# Altium footprint library connectors.PcbLib: 98 footprints (part 1 of 7)
Each footprint in its own frame and in the unit in brackets; x right, y up, seen from the top. Pads: shape width x height; smd on the part's side, far side on the other; paste and mask are expansions set on the pad; w line width, h text height; cw(c..) or ccw(c..) is an arc to the next point about the centre after c.
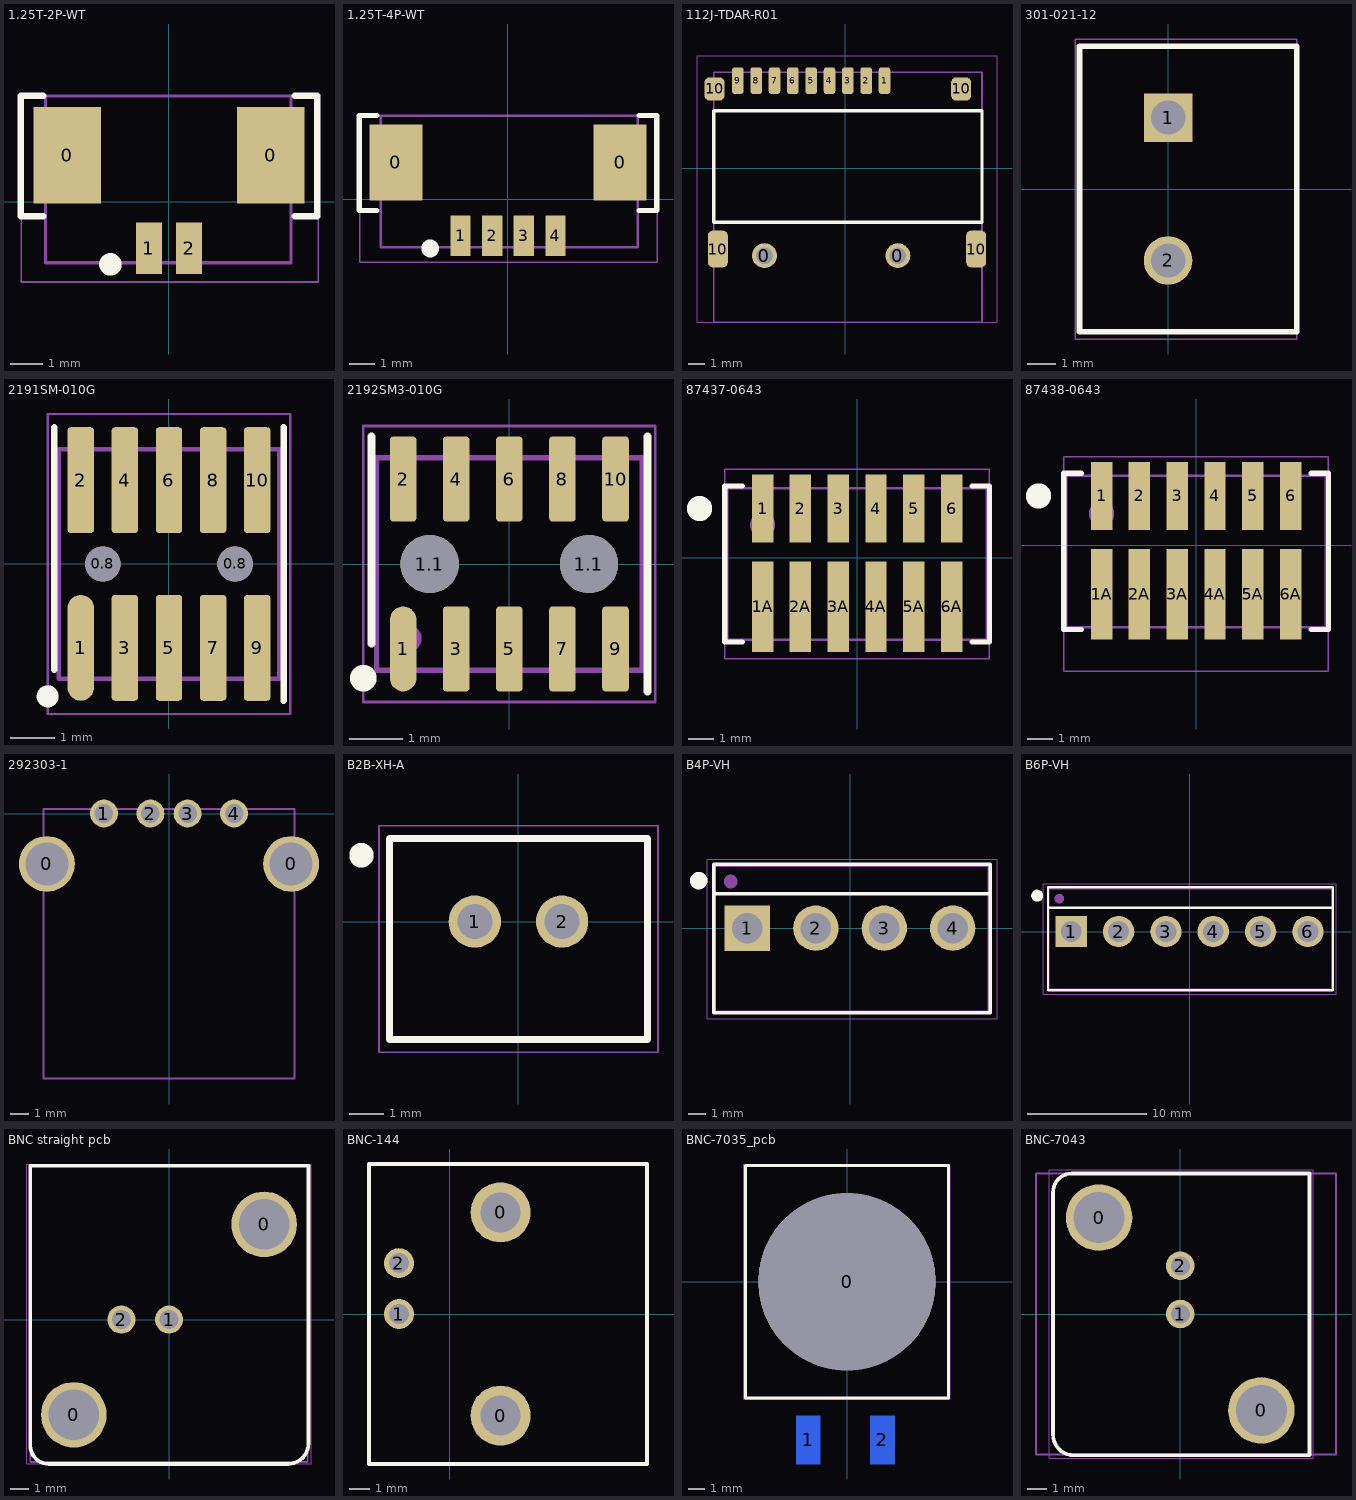
[diagram p0: the footprints below, top view; thin cyan lines are the x and y axes]

## 1.25T-2P-WT [mm]
pads (4):
  rect 2.1x3 smd: 0(-3.175,1.45) 0(3.175,1.45)
  rect 0.8x1.6 smd: 1(-0.625,-1.45) 2(0.625,-1.45)
Top Overlay:
  circle w0.5: c-1.825,-1.95 r0.1
  lines w0.2: -3.925,-0.45 -4.625,-0.45 -4.625,3.3 -3.925,3.3 ; 3.925,-0.45 4.625,-0.45 4.625,3.3 3.925,3.3
Top Assy:
  lines w0.1: -3.85,-1.9 -3.85,3.3 3.8,3.3 3.8,-1.9 -3.85,-1.9
Top Cortyard:
  lines w0.05: -4.6,-2.5 4.65,-2.5 4.65,3.3 -4.6,3.3 -4.6,-2.5
3D body "532610271.stp": height 3.4, standoff 0, extent -3.825,-1.85 3.825,3.35

## 1.25T-4P-WT [mm]
pads (6):
  rect 2.1x3 smd: 0(-4.425,1.45) 0(4.425,1.45)
  rect 0.8x1.6 smd: 1(-1.875,-1.45) 2(-0.625,-1.45) 3(0.625,-1.45) 4(1.875,-1.45)
Top Overlay:
  circle w0.5: c-3.075,-1.95 r0.1
  lines w0.2: -5.175,-0.45 -5.875,-0.45 -5.875,3.3 -5.175,3.3 ; 5.175,-0.45 5.875,-0.45 5.875,3.3 5.175,3.3
Top Assy:
  lines w0.1: -5.025,-1.9 -5.025,3.3 5.125,3.3 5.125,-1.9 -5.025,-1.9
Top Cortyard:
  lines w0.05: -5.85,-2.5 5.9,-2.5 5.9,3.3 -5.85,3.3 -5.85,-2.5
3D body "532610471.stp": height 3.4, standoff 0, extent -5.05,-1.9 5.1,3.3

## 112J-TDAR-R01 [mm]
pads (15):
  round 1.5 hole 1: 0(-4.85,-5.25) 0(3.15,-5.25)
  rrect50% 0.7x1.6 smd: 1(2.35,5.25) 2(1.25,5.25) 3(0.15,5.25) 4(-0.95,5.25) 5(-2.05,5.25) 6(-3.15,5.25) 7(-4.25,5.25) 8(-5.35,5.25) 9(-6.45,5.25)
  rrect50% 1.2x1.4 smd: 10(-7.85,4.75) 10(6.95,4.75)
  rrect50% 1.2x2.2 smd: 10(-7.65,-4.85) 10(7.85,-4.85)
Top Overlay:
  lines w0.2: -7.9,-3.25 -7.9,3.45 8.2,3.45 8.2,-3.25 -7.9,-3.25
Top Assy:
  lines w0.1: -7.9,-9.25 -7.9,5.75 8.2,5.75 8.2,-9.25 -7.9,-9.25
Top Cortyard:
  lines w0.05: -8.9,-9.25 9.1,-9.25 9.1,6.75 -8.9,6.75 -8.9,-9.25
3D body "112J-TXAR-R_C_1.stp": height 1.9, standoff -0.55, extent -7.9,-9.25 8.2,5.753

## 301-021-12 [mm]
height 8.38
pads (2):
  rect 1.7x1.7 hole 1.2: 1(0,2.5)
  round 1.7 hole 1.2: 2(0,-2.5)
Top Overlay:
  lines w0.2: -3.1,-5 4.5,-5 4.5,4.7 4.5,5 4.2,5 -3.1,5 -3.1,-5
Top Assy:
  lines w0.1: -3.1,-5 -3.1,5 4.5,5 4.5,-5 -3.1,-5
Top Cortyard:
  lines w0.05: -3.25,-5.25 4.5,-5.25 4.5,5.25 -3.25,5.25 -3.25,-5.25
3D body "User Library-DG301-5_0-2P12.STEP": height 10, standoff -4.16, extent -3.4,-5 4.2,5.6

## 2191SM-010G [mm]
height 2.25
pads (12):
  round 0.8 hole 0.8 unplated: 0.8(-1.5,0) 0.8(1.5,0)
  oval 0.6x2.4 smd: 1(-2,-1.9)
  rrect25% 0.6x2.4 smd: 2(-2,1.9) 3(-1,-1.9) 4(-1,1.9) 5(0,-1.9) 6(0,1.9) 7(1,-1.9) 8(1,1.9) 9(2,-1.9) 10(2,1.9)
Top Overlay:
  circle w0.3: c-2.75,-3 r0.1
  lines w0.15: -2.6,-2.4 -2.6,3.1 ; 2.6,-3.1 2.6,3.1
Top Assy:
  circle w0.3: c-1.95,-2.1 r0.1
  lines w0.1: -2.5,-2.6 2.5,-2.6 2.5,2.6 -2.5,2.6 -2.5,-2.6
  text ".Designator" at 0,0 h1
Top Cortyard:
  lines w0.05: -2.75,-3.4 -2.75,3.4 2.75,3.4 2.75,-3.4 -2.75,-3.4

## 2192SM3-010G [mm]
height 2.25
pads (12):
  oval 0.5x1.6 smd: 1(-2,-1.6)
  round 1.1 hole 1.1 unplated: 1.1(-1.5,0) 1.1(1.5,0)
  rrect25% 0.5x1.6 smd: 2(-2,1.6) 3(-1,-1.6) 4(-1,1.6) 5(0,-1.6) 6(0,1.6) 7(1,-1.6) 8(1,1.6) 9(2,-1.6) 10(2,1.6)
Top Overlay:
  circle w0.3: c-2.75,-2.15 r0.1
  lines w0.15: -2.6,-1.5 -2.6,2.4 ; 2.6,-2.4 2.6,2.4
Top Assy:
  circle w0.3: c-1.9,-1.4 r0.1
  lines w0.1: -2.5,-2 2.5,-2 2.5,2 -2.5,2 -2.5,-2
  text ".Designator" at 0,0 h1
Top Cortyard:
  lines w0.05: -2.75,-2.6 2.75,-2.6 2.75,2.6 -2.75,2.6 -2.75,-2.6

## 87437-0643 [mm]
pads (12):
  rect 0.85x2.7 smd: 1(-3.75,1.95) 2(-2.25,1.95) 3(-0.75,1.95) 4(0.75,1.95) 5(2.25,1.95) 6(3.75,1.95)
  rect 0.85x3.6 smd: 1A(-3.75,-1.95) 2A(-2.25,-1.95) 3A(-0.75,-1.95) 4A(0.75,-1.95) 5A(2.25,-1.95) 6A(3.75,-1.95)
Top Overlay:
  circle w0.8: c-6.25,1.95 r0.1
  lines w0.2: -4.55,-3.35 -5.25,-3.35 -5.25,2.85 -4.55,2.85 ; 4.55,-3.35 5.25,-3.35 5.25,2.85 4.55,2.85
Top Assy:
  circle w0.8: c-3.75,1.3 r0.1
  lines w0.1: -5.15,-3.25 -5.15,2.75 5.15,2.75 5.15,-3.25 -5.15,-3.25
Top Cortyard:
  lines w0.05: -5.25,-4 -5.25,3.5 5.25,3.5 5.25,-4 -5.25,-4
3D body "874370643.stp": height 5.77, standoff 0.02, extent -5.1,-3.2 5.2,2.8

## 87438-0643 [mm]
pads (12):
  rect 0.85x2.7 smd: 1(-3.75,1.95) 2(-2.25,1.95) 3(-0.75,1.95) 4(0.75,1.95) 5(2.25,1.95) 6(3.75,1.95)
  rect 0.85x3.6 smd: 1A(-3.75,-1.95) 2A(-2.25,-1.95) 3A(-0.75,-1.95) 4A(0.75,-1.95) 5A(2.25,-1.95) 6A(3.75,-1.95)
Top Overlay:
  circle w0.8: c-6.25,1.95 r0.1
  lines w0.2: -4.55,-3.35 -5.25,-3.35 -5.25,2.85 -4.55,2.85 ; 4.55,-3.35 5.25,-3.35 5.25,2.85 4.55,2.85
Top Assy:
  circle w0.8: c-3.75,1.25 r0.1
  lines w0.1: -5.15,-3.25 5.15,-3.25 5.15,2.75 -5.15,2.75 -5.15,-3.25
Top Cortyard:
  lines w0.05: -5.25,-5 5.25,-5 5.25,3.5 -5.25,3.5 -5.25,-5
3D body "874380643.stp": height 4.52, standoff 0.01, extent -5.1,-5 5.2,2.75

## 292303-1 [mm]
pads (6):
  round 3 hole 2.3: 0(-6.57,-2.71) 0(6.57,-2.71)
  round 1.5 hole 1 unplated: 1(-3.5,0) 2(-1,0) 3(1,0) 4(3.5,0)
Top Assy:
  lines w0.1: -6.75,-14.25 6.75,-14.25 6.75,0.25 -6.75,0.25 -6.75,-14.25
  text ".Designator" at -0.65,-7.317 h1
Top Cortyard:
  lines w0.05: -6.75,-14.25 6.75,-14.25 6.75,0.25 -6.75,0.25 -6.75,-14.25

## B2B-XH-A [mm]
height 7
pads (2):
  round 1.5 hole 1: 1(-1.25,0) 2(1.25,0)
Top Overlay:
  circle w0.5: c-4.5,1.9 r0.1
  lines w0.2: -3.7,-3.375 -3.7,2.375 3.7,2.375 3.7,-3.375 -3.7,-3.375
Top Assy:
  lines w0.1: -3.7,-3.375 3.7,-3.375 3.7,2.375 -3.7,2.375 -3.7,-3.375
Top Cortyard:
  lines w0.05: -4,-3.75 -4,2.75 4,2.75 4,-3.75 -4,-3.75
3D body "JST B2B-XH-A.STEP": height 7, standoff -3.4, extent -3.7,-3.375 3.7,2.375

## B4P-VH [mm]
pads (4):
  rect 2.625x2.625 hole 1.75 mask-25.4: 1(-5.94,0)
  round 2.625 hole 1.75 mask-25.4: 2(-1.98,0) 3(1.98,0) 4(5.94,0)
Top Overlay:
  circle w0.8: c-8.75,2.75 r0.1
  lines w0.2: 8.1,2 -7.89,2 ; -7.89,2 -7.89,-4.9 8.1,-4.9 8.1,2.21 8.1,3.7 -7.89,3.7 -7.89,2
Top Assy:
  circle w0.4: c-6.9,2.7 r0.2
  lines w0.1: -7.8,-4.8 8,-4.8 8,3.6 -7.8,3.6 -7.8,-4.8
Top Cortyard:
  lines w0.05: -8.25,-5.25 -8.25,4 8.5,4 8.5,-5.25 -8.25,-5.25
3D body "B4P-VH.STEP": height 10.9, standoff -3.7, extent -7.79,-4.85 7.99,3.65

## B6P-VH [mm]
pads (6):
  rect 2.625x2.625 hole 1.75 mask-25.4: 1(-9.9,0)
  round 2.625 hole 1.75 mask-25.4: 2(-5.94,0) 3(-1.98,0) 4(1.98,0) 5(5.94,0) 6(9.9,0)
Top Overlay:
  circle w0.8: c-12.75,3 r0.1
  lines w0.2: 12,2 -11.85,2 ; -11.85,2 -11.85,3.7 12,3.7 12,-1.45 12,-4.9 -11.85,-4.9 -11.85,2
Top Assy:
  circle w0.4: c-10.9,2.75 r0.2
  lines w0.1: -11.76,-4.8 -11.76,3.6 11.9,3.6 11.9,-4.8 -11.76,-4.8
Top Cortyard:
  lines w0.05: -12.25,-5.25 12.25,-5.25 12.25,4 -12.25,4 -12.25,-5.25
3D body "B6P-VH.STEP": height 10.9, standoff -3.7, extent -11.8,-4.85 11.9,3.65

## BNC straight pcb [mm] "BNC Connector Jack, Female Socket 50 Ohm Panel Mount, Through Hole Solder"
height 35
pads (4):
  round 3.5 hole 2.68: 0(-5.08,-5.08) 0(5.08,5.08)
  round 1.5 hole 1: 1(0,0) 2(-2.54,0)
Top Overlay:
  lines w0.2: -7.404,-6.709 ccw(c-6.404,-6.705) -6.4,-7.705 6.348,-7.705 ccw(c6.348,-6.613) 7.44,-6.613 7.44,8.2 -7.4,8.2 -7.4,-6.709
Top Assy:
  lines w0.1: -7.4,-7.6 -7.4,8.2 7.4,8.2 7.4,-7.6 -7.4,-7.6
Top Cortyard:
  lines w0.05: -7.6,-7.7 -7.6,8.3 7.6,8.3 7.6,-7.7 -7.6,-7.7
3D body "bnc-7043.stp": height 35.5, standoff -4.25, extent -7.38,-7.6 7.38,8.2

## BNC-144 [mm]
pads (4):
  round 3 hole 2: 0(2.54,-5.08) 0(2.54,5.08)
  round 1.5 hole 1: 1(-2.54,0) 2(-2.54,2.54)
Top Overlay:
  lines w0.2: -4.04,-7.5 9.86,-7.5 9.86,7.5 -4.04,7.5 -4.04,-7.5
Top Assy:
  lines w0.1: -4.04,-7.5 -4.04,7.5 9.86,7.5 9.86,-7.5 -4.04,-7.5
Top Cortyard:
  lines w0.05: -4.04,-7.5 9.86,-7.5 9.86,7.5 -4.04,7.5 -4.04,-7.5
3D body "User Library-NCB-0142.STEP": height 13.19, standoff -4.11, extent -3.81,-7.379 31.115,7.379

## BNC-7035_pcb [mm] "BNC Connector Jack, Female Socket 50 Ohm Panel Mount, Through Hole Solder"
height 35
pads (3):
  round 11 hole 11 unplated paste+0: 0(0,0)
  rect 1.5x3 smd far side: 1(-2.4,-9.8) 2(2.2,-9.8)
Top Overlay:
  lines w0.2: -6.3,-7.2 -6.3,7.2 6.3,7.2 6.3,-7.2 -6.3,-7.2
Top Assy:
  lines w0.1: -6.35,-7.25 -6.35,7.25 6.35,7.25 6.35,-7.25 -6.35,-7.25
Top Cortyard:
  lines w0.05: -6.4,-7.3 -6.4,7.3 6.4,7.3 6.4,-7.3 -6.4,-7.3
3D body "BNC-7035.STEP": height 19.46, standoff -8.94, extent -6.35,-7.25 6.35,7.25

## BNC-7043 [mm] "BNC Connector Jack, Female Socket 50 Ohm Panel Mount, Through Hole Solder"
height 35
pads (4):
  round 3.5 hole 2.68: 0(-4.28,5.08) 0(4.27,-5.08)
  round 1.5 hole 1: 1(0,0) 2(0,2.54)
Top Overlay:
  lines w0.2: -5.709,7.4 6.8,7.4 6.8,-7.44 -5.613,-7.44 cw(c-5.613,-6.348) -6.705,-6.348 -6.705,6.4 cw(c-5.705,6.404) -5.709,7.404
Top Assy:
  lines w0.1: -7.6,-7.4 -7.6,7.4 8.2,7.4 8.2,-7.4 -7.6,-7.4
Top Cortyard:
  lines w0.05: -6.9,-7.6 7,-7.6 7,7.6 -6.9,7.6 -6.9,-7.6
3D body "bnc-7043.stp": height 35.5, standoff -4.25, extent -7.6,-7.38 8.2,7.38